# Altium footprint library THU VIEN V1.PcbLib: 400 footprints (part 7 of 25)
Each footprint in its own frame and in the unit in brackets; x right, y up, seen from the top. Pads: shape width x height; smd on the part's side, far side on the other; paste and mask are expansions set on the pad; w line width, h text height; cw(c..) or ccw(c..) is an arc to the next point about the centre after c.
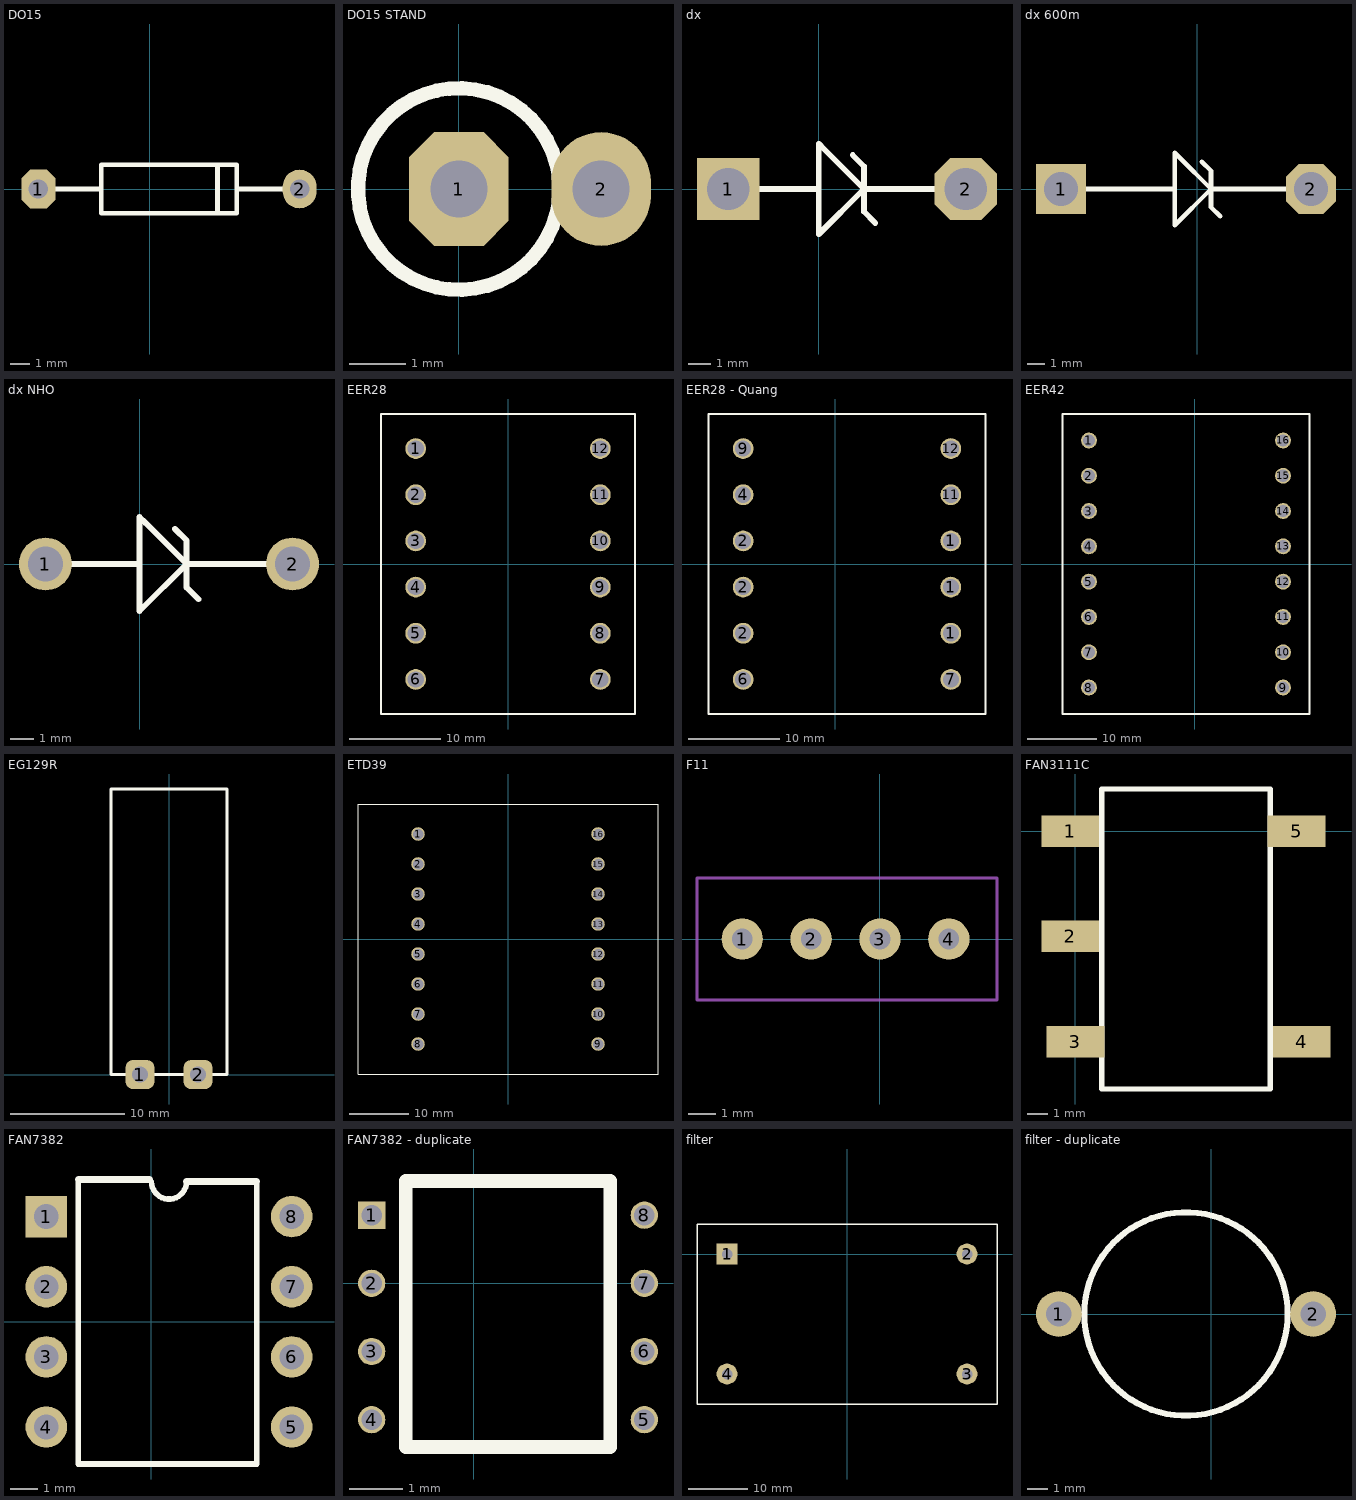
[diagram p6: the footprints below, top view; thin cyan lines are the x and y axes]

## DO15 [mil]
pads (2):
  oct 70x80 hole 40: 1(-230,0)
  oval 70x80 hole 40: 2(310,0)
Top Overlay:
  lines w10: -230,0 -100,0 ; 140,-50 140,50 ; 180,0 310,0 ; -100,-50 -100,50 180,50 180,-50 -100,-50
3D body: height 188.39, standoff -39.37, extent -244.49,-70.17 324.8,70.18

## DO15 STAND [mil]
pads (2):
  oct 70x80 hole 40: 1(0,0)
  oval 70x80 hole 40: 2(100,0)
Top Overlay:
  circle w10: c0,0 r70.87
3D body: height 435.04, standoff -157.48, extent -70.07,-70.07 116.93,70.09

## dx [mil]
pads (2):
  rect 110x110 hole 75: 1(-160,0)
  oct 110x110 hole 75: 2(260,0)
Top Overlay:
  lines w10: -160,0 0,0 ; 60,60 80,40 ; 100,-60 80,-40 ; 260,0 80,0 ; 80,-40 80,40 ; 80,-40 80,40 ; 80,0 10,70 0,80 0,70 0,-80 80,0
3D body: height 105.5, standoff -95, extent -164.99,-50.49 265,50.51

## dx 600m [mil]
pads (2):
  rect 110x110 hole 75: 1(-300,0)
  oct 110x110 hole 75: 2(250,0)
Top Overlay:
  lines w10: -300,0 -50,0 ; 10,60 30,40 ; 50,-60 30,-40 ; 250,0 30,0 ; 30,-40 30,40 ; 30,-40 30,40 ; 30,0 -40,70 -50,80 -50,70 -50,-80 30,0
3D body: height 188.39, standoff -39.37, extent -308.49,-69.17 260.8,71.18

## dx NHO [mil]
pads (2):
  round 90 hole 60: 1(-160,0) 2(260,0)
Top Overlay:
  lines w10: -160,0 0,0 ; 60,60 80,40 ; 100,-60 80,-40 ; 260,0 80,0 ; 80,-40 80,40 ; 80,-40 80,40 ; 80,0 10,70 0,80 0,70 0,-80 80,0
3D body: height 105.5, standoff -95, extent -164.99,-50.49 265,50.51

## EER28 [mil]
pads (12):
  round 90 hole 70: 1(-400,500) 2(-400,300) 3(-400,100) 4(-400,-100) 5(-400,-300) 6(-400,-500) 7(400,-500) 8(400,-300) 9(400,-100) 10(400,100) 11(400,300) 12(400,500)
Top Overlay:
  lines w10: -550,-650 550,-650 550,650 -550,650 -550,-650
3D body: height 847.62, standoff -170, extent -579,-730.5 591,744.51

## EER28 - Quang [mil]
pads (12):
  round 90 hole 70: 1(500,-300) 1(500,-100) 1(500,100) 2(-400,-300) 2(-400,-100) 2(-400,100) 4(-400,300) 6(-400,-500) 7(500,-500) 9(-400,500) 11(500,300) 12(500,500)
Top Overlay:
  lines w10: -550,-650 650,-650 650,650 -550,650 -550,-650
3D body: height 847.62, standoff -170, extent -535,-688.49 635,786.51

## EER42 [mil]
pads (16):
  round 90 hole 70: 1(-600,700) 2(-600,500) 3(-600,300) 4(-600,100) 5(-600,-100) 6(-600,-300) 7(-600,-500) 8(-600,-700) 9(500,-700) 10(500,-500) 11(500,-300) 12(500,-100) 13(500,100) 14(500,300) 15(500,500) 16(500,700)
Top Overlay:
  lines w10: -750,-850 -750,850 650,850 650,-850 -750,-850
3D body: height 847.62, standoff -170, extent -633,-739.49 537,735.51

## EG129R [mm]
pads (2):
  rrect50% 2.524x2.524 hole 1.4: 1(-2.54,0) 2(2.54,0)
Top Overlay:
  lines w0.254: -5.08,0 5.08,0 5.08,25 -5.08,25 -5.08,13.97 -5.08,0

## ETD39 [mil]
pads (16):
  round 90 hole 70: 1(-600,700) 2(-600,500) 3(-600,300) 4(-600,100) 5(-600,-100) 6(-600,-300) 7(-600,-500) 8(-600,-700) 9(600,-700) 10(600,-500) 11(600,-300) 12(600,-100) 13(600,100) 14(600,300) 15(600,500) 16(600,700)
Top Overlay:
  lines w0.5: -1000,-900 1000,-900 1000,900 -1000,900 -1000,-900
3D body: height 1298.82, standoff -135.83, extent -841.37,-798.5 892.48,776.51

## F11 [mil]
pads (4):
  round 60 hole 30: 1(-200,0) 2(-100,0) 3(0,0) 4(100,0)
Mechanical 1:
  lines w3.94: -265.75,-88.58 -265.75,88.58 170,88.58 170,-88.58 -265.75,-88.58
3D body: height 133.86, standoff 0, extent -265.75,-88.58 170,88.58
3D body: height 39.37, standoff -39.37, extent -211.72,-11.79 -188.19,11.79
3D body: height 39.37, standoff -39.37, extent -111.72,-11.79 -88.19,11.79
3D body: height 39.37, standoff -39.37, extent -11.72,-11.79 11.81,11.79
3D body: height 39.37, standoff -39.37, extent 88.28,-11.79 111.81,11.79

## FAN3111C [mil]
pads (5):
  rect 110x60 smd: 1(-10,0) 2(-10,-200) 3(0,-400) 4(430,-400) 5(420,0)
Top Overlay:
  lines w10: 50,-490 50,80 370,80 370,-490 50,-490

## FAN7382 [mm] "DIP; 8 Leads; Row Spacing 7.62 mm; Pitch 2.54 mm"
height 5.08
pads (8):
  rect 1.5x1.5 hole 0.9: 1(-3.81,3.81)
  round 1.5 hole 0.9: 2(-3.81,1.27) 3(-3.81,-1.27) 4(-3.81,-3.81) 5(5.08,-3.81) 6(5.08,-1.27) 7(5.08,1.27) 8(5.08,3.81)
Top Overlay:
  lines w0.2: -2.65,5.15 -2.65,-5.15 3.81,-5.15 3.81,5.08 ; 0,5.08 ccw(c0.635,5.08) 1.27,5.08
  lines w0.254: -2.65,5.15 -0.07,5.15 ; 1.27,5.08 3.81,5.08

## FAN7382 - duplicate [mil]
pads (8):
  rect 20x20 hole 15: 1(-75,50)
  round 20 hole 15: 2(-75,0) 3(-75,-50) 4(-75,-100) 5(125,-100) 6(125,-50) 7(125,0) 8(125,50)
Top Overlay:
  lines w10: -50,-120 -50,-100 -50,75 ; -50,-120 -50,75 ; -50,-120 100,-120 100,75 -50,75

## filter [mil]
pads (4):
  rect 140x140 hole 70: 1(-800,0)
  round 140 hole 70: 2(800,0) 3(800,-800) 4(-800,-800)
Top Overlay:
  lines w10: -1000,-1000 -1000,200 1000,200 1000,-1000 -1000,-1000

## filter - duplicate [mil]
pads (2):
  round 90 hole 50: 1(-300,0) 2(200,0)
Top Overlay:
  circle w12: c-50,0 r200
  lines w10: -300,0 -250,0 ; 150,0 200,0
3D body: height 440.94, standoff -196.85, extent -213.38,-163.38 113.39,163.39